# Altium footprint library Connector DSUB.PcbLib: 34 footprints (part 3 of 3)
Each footprint in its own frame and in the unit in brackets; x right, y up, seen from the top. Pads: shape width x height; smd on the part's side, far side on the other; paste and mask are expansions set on the pad; w line width, h text height; cw(c..) or ccw(c..) is an arc to the next point about the centre after c.
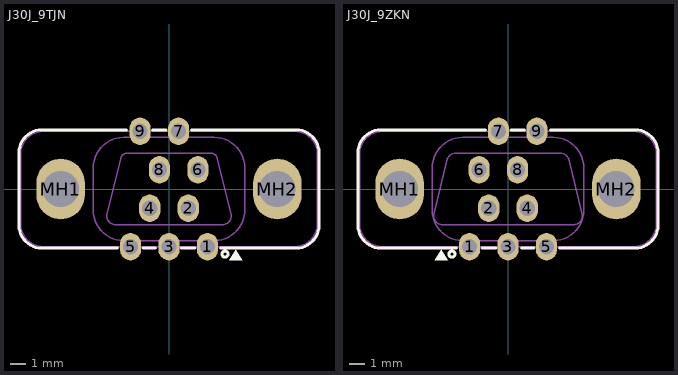
[diagram p2: the footprints below, top view; thin cyan lines are the x and y axes]

## J30J_9TJN [mm] "J30J-9TJN ANOVAY"
pads (11):
  oval 1.4x1.8 hole 1: 1(2.54,-3.81) 2(1.27,-1.27) 3(0,-3.81) 4(-1.27,-1.27) 5(-2.54,-3.81) 6(1.905,1.27) 7(0.635,3.81) 8(-0.635,1.27) 9(-1.905,3.81)
  oval 3.2x4 hole 2.4: MH1(-7.15,0) MH2(7.15,0)
Top Overlay:
  circle w0.2: c3.7,-4.3 r0.2
  region: 3.98,-4.7 4.82,-4.7 4.4,-4
  lines w0.2: -3.4,-3.9 -8.4,-3.9 cw(c-8.4,-2.4) -9.9,-2.4 -9.9,2.4 cw(c-8.4,2.4) -8.4,3.9 -2.8,3.9 ; -1.7,-3.9 -0.9,-3.9 ; -1.1,3.9 -0.2,3.9 ; 0.8,-3.9 1.7,-3.9 ; 1.5,3.9 8.4,3.9 cw(c8.4,2.4) 9.9,2.4 9.9,-2.4 cw(c8.4,-2.4) 8.4,-3.9 3.4,-3.9
Mechanical 1:
  lines w0.1: -9.8,-2.3 ccw(c-8.3,-2.3) -8.3,-3.8 8.3,-3.8 ccw(c8.3,-2.3) 9.8,-2.3 9.8,2.3 ccw(c8.3,2.3) 8.3,3.8 -8.3,3.8 ccw(c-8.3,2.3) -9.8,2.3 -9.8,-2.3 ; -5,-1.4 ccw(c-3,-1.4) -3,-3.4 3,-3.4 ccw(c3,-1.4) 5,-1.4 5,1.4 ccw(c3,1.4) 3,3.4 -3,3.4 ccw(c-3,1.4) -5,1.4 -5,-1.4 ; -4.1,-1.7 ccw(c-3.525,-1.775) -3.6,-2.35 3.6,-2.35 ccw(c3.525,-1.775) 4.1,-1.7 3.2,2 ccw(c2.8,1.95) 2.75,2.35 -2.75,2.35 ccw(c-2.8,1.95) -3.2,2 -4.1,-1.7
3D body: height 9.2, standoff 0, extent 5.55,-1.599 8.75,1.599
3D body: height 16.2, standoff 11.6, extent -4,-2.25 4,2.25
3D body: height 16.2, standoff 5.7, extent 1.607,0.336 2.205,0.935
3D body: height 16.2, standoff 5.7, extent 0.337,0.336 0.935,0.935
3D body: height 16.2, standoff 5.7, extent -2.203,0.336 -1.605,0.935
3D body: height 16.2, standoff 5.7, extent -0.933,0.336 -0.335,0.935
3D body: height 16.2, standoff 5.7, extent 2.239,-0.934 2.837,-0.335
3D body: height 16.2, standoff 5.7, extent 0.97,-0.934 1.567,-0.336
3D body: height 16.2, standoff 5.7, extent -2.837,-0.934 -2.24,-0.335
3D body: height 16.2, standoff 5.7, extent -1.567,-0.934 -0.97,-0.335
3D body: height 9.2, standoff 5.7, extent -5,-3.4 5,3.4
3D body: height 16.2, standoff 5.7, extent -0.298,-0.934 0.3,-0.336
3D body: height 11.6, standoff 9.2, extent -9.8,-3.8 9.8,3.8
3D body: height 16.2, standoff 11.6, extent -4.122,-2.351 4.1,2.35
3D body: height 16.2, standoff 11.6, extent 5.55,-1.725 8.75,1.725
3D body: height 16.2, standoff 11.6, extent -8.75,-1.725 -5.55,1.725
3D body: height 9.2, standoff 0, extent -8.75,-1.599 -5.55,1.599

## J30J_9ZKN [mm] "J30J-9ZKN ANOVAY"
pads (11):
  oval 1.4x1.8 hole 1: 1(-2.54,-3.81) 2(-1.27,-1.27) 3(0,-3.81) 4(1.27,-1.27) 5(2.54,-3.81) 6(-1.905,1.27) 7(-0.635,3.81) 8(0.635,1.27) 9(1.905,3.81)
  oval 3.2x4 hole 2.4: MH1(-7.15,0) MH2(7.15,0)
Top Overlay:
  circle w0.2: c-3.7,-4.3 r0.2
  region: -3.98,-4.7 -4.82,-4.7 -4.4,-4
  lines w0.2: -3.4,-3.9 -8.4,-3.9 cw(c-8.4,-2.4) -9.9,-2.4 -9.9,2.4 cw(c-8.4,2.4) -8.4,3.9 -1.5,3.9 ; -1.7,-3.9 -0.8,-3.9 ; 0.2,3.9 1.1,3.9 ; 0.9,-3.9 1.7,-3.9 ; 2.8,3.9 8.4,3.9 cw(c8.4,2.4) 9.9,2.4 9.9,-2.4 cw(c8.4,-2.4) 8.4,-3.9 3.4,-3.9
Mechanical 1:
  lines w0.1: -9.8,-2.3 ccw(c-8.3,-2.3) -8.3,-3.8 8.3,-3.8 ccw(c8.3,-2.3) 9.8,-2.3 9.8,2.3 ccw(c8.3,2.3) 8.3,3.8 -8.3,3.8 ccw(c-8.3,2.3) -9.8,2.3 -9.8,-2.3 ; -5,-1.4 ccw(c-3,-1.4) -3,-3.4 3,-3.4 ccw(c3,-1.4) 5,-1.4 5,1.4 ccw(c3,1.4) 3,3.4 -3,3.4 ccw(c-3,1.4) -5,1.4 -5,-1.4 ; -4.9,-1.7 ccw(c-4.325,-1.775) -4.4,-2.35 4.4,-2.35 ccw(c4.325,-1.775) 4.9,-1.7 4,2 ccw(c3.466,1.778) 3.55,2.35 -3.55,2.35 ccw(c-3.466,1.778) -4,2 -4.9,-1.7
3D body: height 9.2, standoff 0, extent 5.55,-1.599 8.75,1.599
3D body: height 16.2, standoff 11.6, extent 5.55,-1.725 8.75,1.725
3D body: height 9.2, standoff 0, extent -8.75,-1.599 -5.55,1.599
3D body: height 16.2, standoff 11.6, extent -8.75,-1.725 -5.55,1.725
3D body: height 16.2, standoff 5.7, extent -2.986,-1.08 -2.09,-0.185
3D body: height 16.2, standoff 5.7, extent -2.351,0.19 -1.455,1.084
3D body: height 16.2, standoff 5.7, extent -1.716,-1.08 -0.82,-0.186
3D body: height 16.2, standoff 5.7, extent -1.081,0.19 -0.185,1.084
3D body: height 16.2, standoff 5.7, extent 0.189,0.19 1.085,1.084
3D body: height 16.2, standoff 5.7, extent 1.459,0.19 2.355,1.084
3D body: height 16.2, standoff 5.7, extent 2.093,-1.08 2.989,-0.185
3D body: height 16.2, standoff 5.7, extent 0.823,-1.08 1.72,-0.186
3D body: height 16.2, standoff 5.7, extent -0.446,-1.08 0.45,-0.186
3D body: height 11.6, standoff 9.2, extent -9.789,-3.799 9.811,3.801
3D body: height 9.2, standoff 5.7, extent -4.989,-3.399 5.011,3.401
3D body: height 16.2, standoff 11.6, extent -4.9,-2.35 4.9,2.35